# Altium integrated library Connecteurs.IntLib: 41 symbols
Pins are listed as number, name and electrical type; pins without a type are passive.

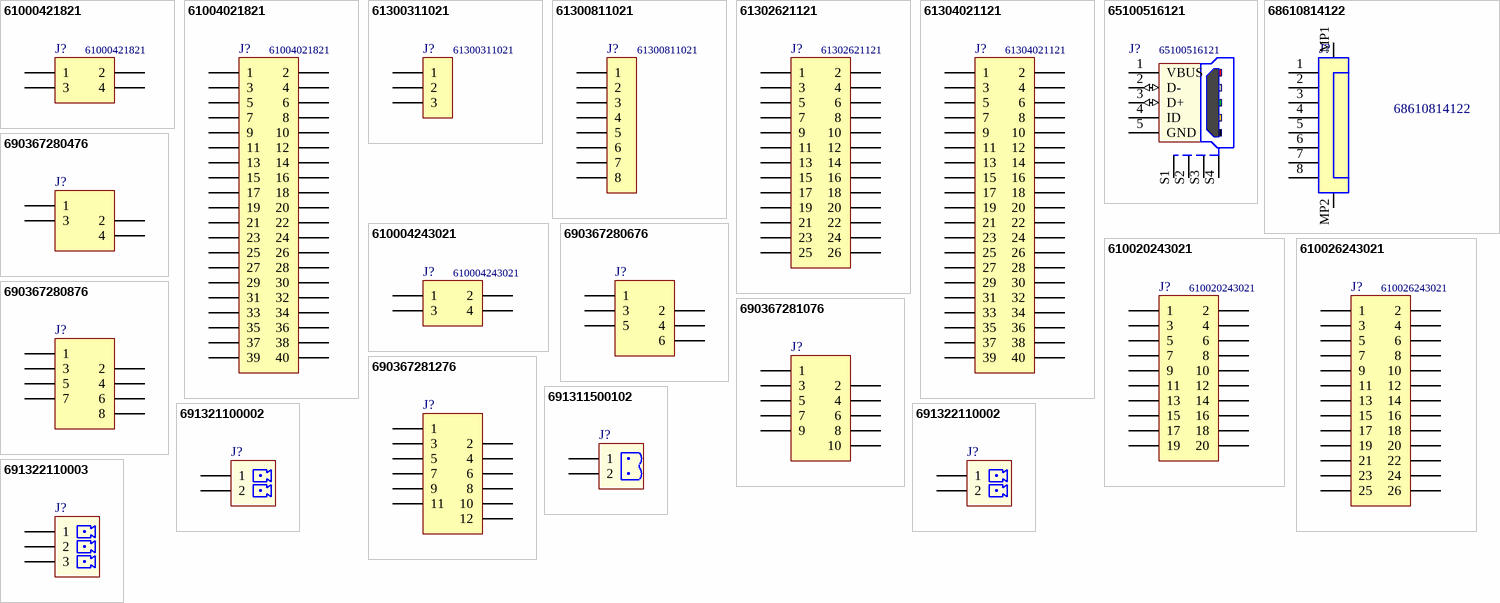
[diagram p0: symbols 61000421821 to 691322110003]

## 61000421821
designator J?
WR-PHD Socket Header, SMT, pitch 2.54mm, Dual Row, Vertical, 4p; Manufacturer: Wurth Elektronik; Value: 4; ComponentLink1Description: Datasheet; ComponentLink1URL: https://www.we-online.com/catalog/datasheet/61000421821.pdf; Manufacturer Part Number: 61000421821; Supplier 1: Farnell; Supplier Part Number 1: 2827865
footprint 61000421821
pins: 1, 2, 3, 4

## 61004021821
designator J?
WR-PHD Socket Header, SMT, pitch 2.54mm, Dual Row, Vertical, 40p; Manufacturer: Wurth Elektronik; Value: 40; ComponentLink1Description: Datasheet; ComponentLink1URL: https://www.we-online.com/catalog/datasheet/61004021821.pdf; Manufacturer Part Number: 61004021821; Supplier 1: Farnell; Supplier Part Number 1: 2827882
footprint 61004021821
pins: 1, 2, 3, 4, 5, 6, 7, 8, 9, 10, 11, 12, 13, 14, 15, 16, 17, 18, 19, 20, 21, 22, 23, 24, 25, 26, 27, 28, 29, 30, 31, 32, 33, 34, 35, 36, 37, 38, 39, 40

## 61300311021
designator J?
WR-PHD Header THT 2.54mm, Single Row, Angled, 3pin; Manufacturer: Wurth Electronics Inc.; Value: 3; ComponentLink1Description: Datasheet; ComponentLink1URL: https://www.we-online.com/catalog/datasheet/61300311021.pdf; Manufacturer Part Number: 61300311021; Supplier 1: Farnell; Supplier Part Number 1: 2356177
footprint 61300311021 (Pin Header, pitch 2.54 mm, THT, Angled, single row, 3p)
pins: 1, 2, 3

## 61300811021
designator J?
WR-PHD Header THT 2.54mm, Single Row, Angled, 8pin; Manufacturer: Wurth Electronics Inc.; Value: 8; ComponentLink1Description: Datasheet; ComponentLink1URL: https://www.we-online.com/catalog/datasheet/61300811021.pdf; Manufacturer Part Number: 61300811021; Supplier Part Number 1: 2356183; Supplier 1: Farnell
footprint 61300811021
pins: 1, 2, 3, 4, 5, 6, 7, 8

## 61302621121
designator J?
WR-PHD Pin Header, THT, pitch 2.54mm, Dual Row, Vertical, 26p; Manufacturer: Wurth Elektronik; Value: 26; ComponentLink1Description: Datasheet; ComponentLink1URL: https://www.we-online.com/catalog/datasheet/61302621121.pdf; Manufacturer Part Number: 61302621121; Supplier 1: Farnell; Supplier Part Number 1: 2356141
footprint 61302621121
pins: 1, 2, 3, 4, 5, 6, 7, 8, 9, 10, 11, 12, 13, 14, 15, 16, 17, 18, 19, 20, 21, 22, 23, 24, 25, 26

## 61304021121
designator J?
WR-PHD Pin Header, THT, pitch 2.54mm, Dual Row, Vertical, 40p; Manufacturer: Wurth Elektronik; Value: 40; ComponentLink1Description: Datasheet; ComponentLink1URL: https://www.we-online.com/catalog/datasheet/61304021121.pdf; Manufacturer Part Number: 61304021121; Supplier 1: Farnell; Supplier Part Number 1: 2356148
footprint 61304021121
pins: 1, 2, 3, 4, 5, 6, 7, 8, 9, 10, 11, 12, 13, 14, 15, 16, 17, 18, 19, 20, 21, 22, 23, 24, 25, 26, 27, 28, 29, 30, 31, 32, 33, 34, 35, 36, 37, 38, 39, 40

## 65100516121
designator J?
Mini USB 2.0 Type B, Receptacle, Horizontal, SMT; Manufacturer: Wurth Elektronik; Value: 5; ComponentLink1Description: Manufacturer; ComponentLink1URL: https://www.we-online.com/catalog/en/COM_SMT_MINI_TYPE_B_HORIZONTAL/#65100516121; ComponentLink2Description: Datasheet; ComponentLink2URL: https://katalog.we-online.com/em/datasheet/65100516121.pdf; Manufacturer Part Number: 65100516121; Supplier 1: Farnell; Supplier Part Number 1: 1642036
footprint 65100516121
pins: 1 VBUS, 2 D- (io), 3 D+ (io), 4 ID, 5 GND, S1 Shield, S2 Shield, S3 Shield, S4 Shield

## 68610814122
designator J?
WR-FPC SMT ZIF Horizontal Top Contact, pitch 1mm, 8p; Manufacturer: Wurth Electronics Inc.; Value: 8; Manufacturer Part Number: 68610814122; ComponentLink1URL: https://www.we-online.com/catalog/datasheet/68610814122.pdf; ComponentLink1Description: Datasheet; Supplier 1: Farnell; Supplier Part Number 1: 1641905
footprint 68610814122 (ZIF Connectors, Horizontal, Top Contact, pitch 1mm, 8p)
pins: 1, 2, 3, 4, 5, 6, 7, 8, MP1, MP2

## 610004243021
designator J?
WR-PHD Socket Header, SMT, pitch 2.54mm, Dual Row, Vertical, 4p; Manufacturer: Wurth Elektronik; Value: 4; ComponentLink1Description: Datasheet; ComponentLink1URL: https://www.we-online.com/catalog/datasheet/610004243021.pdf; Manufacturer Part Number: 610004243021; Supplier 1: Farnell; Supplier Part Number 1: 2827931
footprint 610004243021
footprint 610004243021_NO-HOLE (Socket Header, Pitch 2.54 mm, SMT, Vertical, dual row, 4p)
pins: 1, 2, 3, 4

## 610020243021
designator J?
WR-PHD Socket Header, SMT, pitch 2.54mm, Dual Row, Vertical, 20p; Manufacturer: Wurth Elektronik; Value: 20; ComponentLink1Description: Datasheet; ComponentLink1URL: https://www.we-online.com/catalog/datasheet/610020243021.pdf; Manufacturer Part Number: 610020243021; Supplier 1: Farnell; Supplier Part Number 1: 2827937
footprint 610020243021
footprint 610020243021_NO-HOLE (Socket Header, Pitch 2.54 mm, SMT, Vertical, dual row, 20p)
pins: 1, 2, 3, 4, 5, 6, 7, 8, 9, 10, 11, 12, 13, 14, 15, 16, 17, 18, 19, 20

## 610026243021
designator J?
WR-PHD Socket Header, SMT, pitch 2.54mm, Dual Row, Vertical, 26p; Manufacturer: Wurth Elektronik; Value: 26; ComponentLink1Description: Datasheet; ComponentLink1URL: https://www.we-online.com/catalog/datasheet/610026243021.pdf; Manufacturer Part Number: 610026243021; Supplier 1: Farnell; Supplier Part Number 1: 2827940
footprint 610026243021
footprint 610026243021_NO-HOLE (Socket Header, Pitch 2.54 mm, SMT, Vertical, dual row, 26p)
pins: 1, 2, 3, 4, 5, 6, 7, 8, 9, 10, 11, 12, 13, 14, 15, 16, 17, 18, 19, 20, 21, 22, 23, 24, 25, 26

## 690367280476
designator J?  (value not drawn)
WR-MM 4p Female SMT Connector with Polarization; Manufacturer: Wurth Electronics Inc.; Value: 4; ComponentLink1Description: Datasheet; ComponentLink1URL: http://katalog.we-online.de/em/datasheet/69036728xx76.pdf; Manufacturer Part Number: 690367280476; Supplier 1: Farnell; Supplier Part Number 1: 1641848
footprint 690367280476 (without Latch, 4 pins, SMT, straight)
pins: 1, 2, 3, 4

## 690367280676
designator J?  (value not drawn)
WR-MM 6p Female SMT Connector with Polarization; Manufacturer: Wurth Electronics Inc.; Value: 6; ComponentLink1Description: Datasheet; ComponentLink1URL: http://katalog.we-online.de/em/datasheet/69036728xx76.pdf; Manufacturer Part Number: 690367280676; Supplier 1: Farnell; Supplier Part Number 1: 1641849
footprint 690367280676 (without Latch, 6 pins, SMT, straight)
pins: 1, 2, 3, 4, 5, 6

## 690367280876
designator J?  (value not drawn)
WR-MM 8p Female SMT Connector with Polarization; Manufacturer: Wurth Electronics Inc.; Value: 8; Manufacturer Part Number: 690367280876; ComponentLink1Description: Datasheet; ComponentLink1URL: http://katalog.we-online.de/em/datasheet/69036728xx76.pdf; Supplier 1: Farnell; Supplier Part Number 1: 1641850
footprint 690367280876 (without Latch, 8 pins, SMT, straight)
pins: 1, 2, 3, 4, 5, 6, 7, 8

## 690367281076
designator J?  (value not drawn)
WR-MM 10p Female SMT Connector with Polarization; Manufacturer: Wurth Electronics Inc.; Value: 10; Manufacturer Part Number: 690367281076; ComponentLink1Description: Datasheet; ComponentLink1URL: http://katalog.we-online.de/em/datasheet/69036728xx76.pdf; Supplier 1: Farnell; Supplier Part Number 1: 1641851
footprint 690367281076 (without Latch, 10 pins, SMT, straight)
pins: 1, 2, 3, 4, 5, 6, 7, 8, 9, 10

## 690367281276
designator J?  (value not drawn)
WR-MM 12p Female SMT Connector with Polarization; Manufacturer: Wurth Electronics Inc.; Value: 12; Manufacturer Part Number: 690367281276; ComponentLink1Description: Datasheet; ComponentLink1URL: http://katalog.we-online.de/em/datasheet/69036728xx76.pdf; Supplier 1: Farnell; Supplier Part Number 1: 2984330
footprint 690367281276 (without Latch, 12 pins, SMT, straight)
pins: 1, 2, 3, 4, 5, 6, 7, 8, 9, 10, 11, 12

## 691311500102
designator J?  (value not drawn)
WR-TBL 2p Series 311 - 5.08 mm Closed Vertical PCB Header; Manufacturer: Wurth Electronics Inc.; Value: 2; Manufacturer Part Number: 691311500102; ComponentLink1Description: Datasheet; ComponentLink1URL: https://katalog.we-online.de/em/datasheet/6913115001xx.pdf; Supplier 1: Farnell; Supplier Part Number 1: 1641978
footprint 691311500102 (5,08mm - PCB Headers - Vertical - Closed ends -02p)
pins: 1, 2

## 691321100002
designator J?  (value not drawn)
WR-TBL 2p Series 3211 - 3.50 mm Vertical PCB Header; Manufacturer: Wurth Electronics Inc.; Value: 2; Supplier 1: Farnell; Manufacturer Part Number: 691321100002; Supplier Part Number 1: 1841308; ComponentLink1Description: Datasheet; ComponentLink1URL: https://katalog.we-online.de/em/datasheet/6913211000xx.pdf
footprint 691321100002 (Vertical PCB Header, pitch 3.5mm, 02p)
pins: 1, 2

## 691322110002
designator J?  (value not drawn)
WR-TBL 2p Series 3221 - 3.50 mm Horizontal PCB Header; Manufacturer: Wurth Electronics Inc.; Value: 2; Supplier 1: Farnell; Manufacturer Part Number: 691322110002; Supplier Part Number 1: 1841315; ComponentLink1Description: Datasheet; ComponentLink1URL: http://katalog.we-online.de/em/datasheet/6913221100xx.pdf
footprint 691322110002 (Horizontal PCB Header, pitch 3.5mm, 02p)
pins: 1, 2

## 691322110003
designator J?  (value not drawn)
WR-TBL 3p Series 3221 - 3.50 mm Horizontal PCB Header; Manufacturer: Wurth Electronics Inc.; Value: 3; Supplier 1: Farnell; Manufacturer Part Number: 691322110003; Supplier Part Number 1: 1841316; ComponentLink1Description: Datasheet; ComponentLink1URL: http://katalog.we-online.de/em/datasheet/6913221100xx.pdf
footprint 691322110003 (Horizontal PCB Header, pitch 3.5mm, 03p)
pins: 1, 2, 3


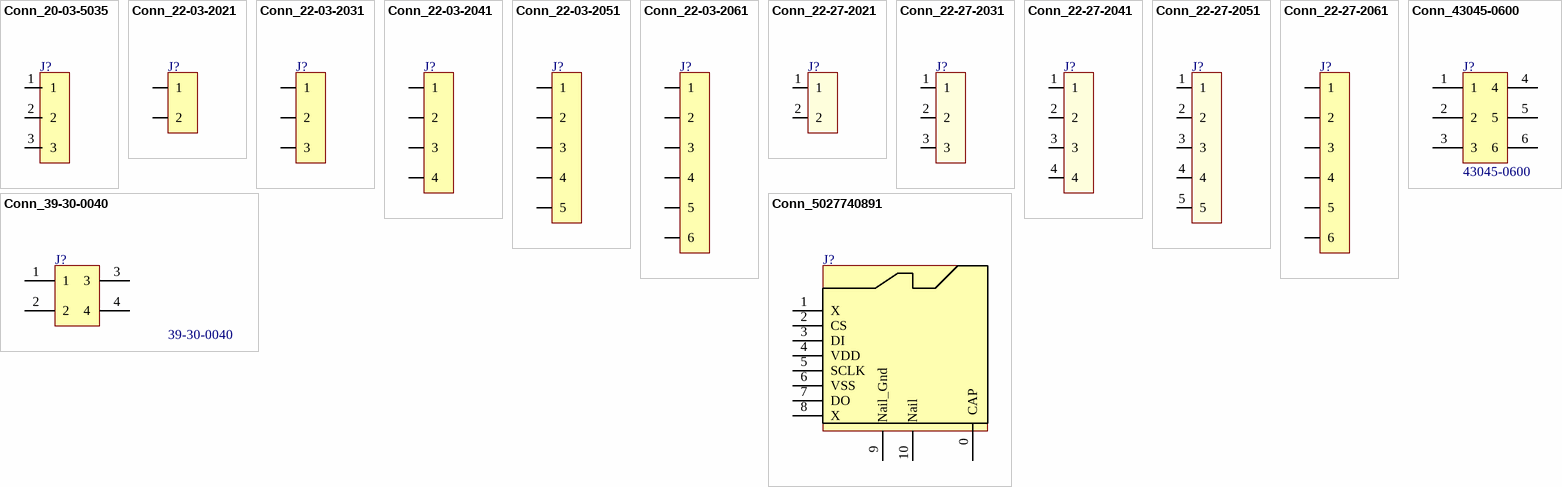
[diagram p1: symbols Conn_20-03-5035 to Conn_5027740891]

## Conn_20-03-5035
designator J?, comment 22-03-5035  (value not drawn)
CONN HEADER VERT 3POS 2.5MM; Manufacturer: MOLEX; Supplier 1: Farnell; Supplier Part Number 1: 9979620; Manufacturer Part Number: 22-03-5035; ComponentLink1URL: http://www.farnell.com/datasheets/1801024.pdf; ComponentLink1Description: Datasheet; ComponentLink2URL: http://www.farnell.com/cad/495071.pdf  http://www.farnell.com/cad/1533907.pdf  http://www.farnell.com/cad/1533907.pdf; ComponentLink2Description: Drawings
footprint Conn_20-03-5035
pins: 1, 2, 3

## Conn_22-03-2021
designator J?, comment 22-03-2021  (value not drawn)
CONN HEADER VERT 2POS 2.54MM; Manufacturer: MOLEX; Supplier 1: Farnell; Supplier Part Number 1: 9731075; Manufacturer Part Number: 22-03-2021; ComponentLink1URL: http://www.farnell.com/datasheets/1791308.pdf; ComponentLink1Description: Datasheet; ComponentLink2URL: http://www.farnell.com/cad/495071.pdf  http://www.farnell.com/cad/1533907.pdf  http://www.farnell.com/cad/1533907.pdf; ComponentLink2Description: Drawings
footprint Conn_22-03-2021
pins: 1, 2

## Conn_22-03-2031
designator J?, comment 22-03-2031  (value not drawn)
CONN HEADER VERT 3POS 2.54MM; Manufacturer: MOLEX; Supplier 1: Farnell; Supplier Part Number 1: 9731083; Manufacturer Part Number: 22-03-2031; ComponentLink1URL: http://www.farnell.com/datasheets/1785732.pdf; ComponentLink1Description: Datasheet; ComponentLink2URL: http://www.farnell.com/cad/495071.pdf  http://www.farnell.com/cad/1533907.pdf  http://www.farnell.com/cad/1533907.pdf; ComponentLink2Description: Drawings
footprint Conn_22-03-2031
pins: 1, 2, 3

## Conn_22-03-2041
designator J?, comment 22-03-2041  (value not drawn)
CONN HEADER VERT 4POS 2.54MM; Manufacturer: MOLEX; Manufacturer Part Number: 22-03-2041; Supplier 1: Farnell; Supplier Part Number 1: 9731091; ComponentLink1Description: Datasheet; ComponentLink1URL: https://www.molex.com/pdm_docs/sd/022032041_sd.pdf
footprint Conn_22-03-2041
pins: 1, 2, 3, 4

## Conn_22-03-2051
designator J?, comment 22-03-2051  (value not drawn)
CONN HEADER VERT 5POS 2.54MM; Manufacturer: MOLEX; Supplier 1: Farnell; Supplier Part Number 1: 9731105; Manufacturer Part Number: 22-03-2051; ComponentLink1URL: http://www.farnell.com/datasheets/1803075.pdf; ComponentLink1Description: Datasheet; ComponentLink2URL: http://www.farnell.com/cad/1533907.pdf; ComponentLink2Description: Drawings
footprint Conn_22-03-2051
pins: 1, 2, 3, 4, 5

## Conn_22-03-2061
designator J?, comment 22-03-2061  (value not drawn)
CONN HEADER VERT 6POS 2.54MM; Manufacturer: MOLEX; Supplier 1: Farnell; Supplier Part Number 1: 9731113; Manufacturer Part Number: 22-03-2061; ComponentLink1URL: http://www.farnell.com/datasheets/1791310.pdf; ComponentLink1Description: Datasheet; ComponentLink2URL: http://www.farnell.com/cad/1533907.pdf; ComponentLink2Description: Drawings
footprint Conn_22-03-2061
pins: 1, 2, 3, 4, 5, 6

## Conn_22-27-2021
designator J?, comment 22-27-2021  (value not drawn)
CONN HEADER VERT KK 2POS 2.54MM; Manufacturer: MOLEX; Supplier 1: Farnell; Supplier Part Number 1: 9731148; Manufacturer Part Number: 22-27-2021; ComponentLink1URL: http://www.farnell.com/datasheets/1795001.pdf; ComponentLink1Description: Datasheet; ComponentLink2URL: http://www.farnell.com/cad/1595526.pdf; ComponentLink2Description: Drawings
footprint Conn_22-27-2021
pins: 1, 2

## Conn_22-27-2031
designator J?, comment 22-27-2031  (value not drawn)
CONN HEADER VERT KK 3POS 2.54MM; Manufacturer: MOLEX; Supplier 1: Farnell; Supplier Part Number 1: 9731156; Manufacturer Part Number: 22-27-2031; ComponentLink1URL: http://www.farnell.com/datasheets/1803078.pdf; ComponentLink1Description: Datasheet; ComponentLink2URL: http://www.farnell.com/cad/1595526.pdf; ComponentLink2Description: Drawings
footprint Conn_22-27-2031
pins: 1, 2, 3

## Conn_22-27-2041
designator J?, comment 22-27-2041  (value not drawn)
CONN HEADER VERT KK 4POS 2.54MM; Manufacturer: MOLEX; Supplier 1: Farnell; Supplier Part Number 1: 9731164; Manufacturer Part Number: 22-27-2041; ComponentLink1URL: http://www.farnell.com/datasheets/1803079.pdf; ComponentLink1Description: Datasheet; ComponentLink2URL: http://www.farnell.com/cad/1595526.pdf; ComponentLink2Description: Drawings
footprint Conn_22-27-2041
pins: 1, 2, 3, 4 (power)

## Conn_22-27-2051
designator J?, comment 22-27-2051  (value not drawn)
CONN HEADER VERT KK 5POS 2.54MM; Manufacturer: MOLEX; Supplier 1: Farnell; Supplier Part Number 1: 9731679; Manufacturer Part Number: 22-27-2051; ComponentLink1URL: http://www.farnell.com/datasheets/1802972.pdf; ComponentLink1Description: Datasheet; ComponentLink2URL: http://www.farnell.com/cad/1595526.pdf; ComponentLink2Description: Drawings
footprint Conn_22-27-2051
pins: 1, 2, 3, 4, 5

## Conn_22-27-2061
designator J?, comment 22-27-2061  (value not drawn)
CONN HEADER VERT KK 6POS 2.54MM; Manufacturer: MOLEX; Supplier 1: Farnell; Supplier Part Number 1: 9731172; Manufacturer Part Number: 22-27-2061; ComponentLink1URL: http://www.farnell.com/datasheets/1791334.pdf; ComponentLink1Description: Datasheet; ComponentLink2URL: http://www.farnell.com/cad/1595526.pdf; ComponentLink2Description: Drawings
footprint Conn_22-27-2061
pins: 1, 2, 3, 4, 5, 6

## Conn_39-30-0040
designator J?, comment 39-30-0040
CONN HEADER R/A  MINI-FIT 4POS 4.2MM; Manufacturer: MOLEX; Supplier 1: Farnell; Supplier Part Number 1: 1697133; Manufacturer Part Number: 39-30-0040; ComponentLink1URL: https://www.molex.com/pdm_docs/sd/039300040_sd.pdf; ComponentLink1Description: Datasheet
footprint Conn_39-30-0040 (4 pins, straight)
pins: 1, 2, 3, 4

## Conn_43045-0600
designator J?, comment 43045-0600
CONN HEADER R/A MICRO-FIT 6POS 3MM; Manufacturer: MOLEX; Supplier 1: Farnell; Manufacturer Part Number: 43045-0600; ComponentLink1URL: http://www.farnell.com/datasheets/2216475.pdf; ComponentLink1Description: Datasheet; Supplier Part Number 1: 1012252
footprint Conn_43045-0600 (6 pins, straight)
pins: 1, 2, 3, 4, 5, 6

## Conn_5027740891
designator J?, comment 5027740891  (value not drawn)
CONN MICRO SD CARD PUSH-PUSH R/A; Manufacturer: MOLEX; Manufacturer Part Number: 5027740891; Supplier 1: Farnell; Supplier Part Number 1: 2064063; ComponentLink2Description: Drawings; ComponentLink2URL: https://www.molex.com/pdm_docs/sd/5027740891_sd.pdf; ComponentLink1Description: Datasheet; ComponentLink1URL: https://www.molex.com/pdm_docs/sd/5027740891_sd.pdf
footprint Conn_502774-0891
pins: 0 CAP, 1 X, 2 CS, 3 DI, 4 VDD, 5 SCLK, 6 VSS, 7 DO, 8 X, 9 Nail_Gnd, 10 Nail


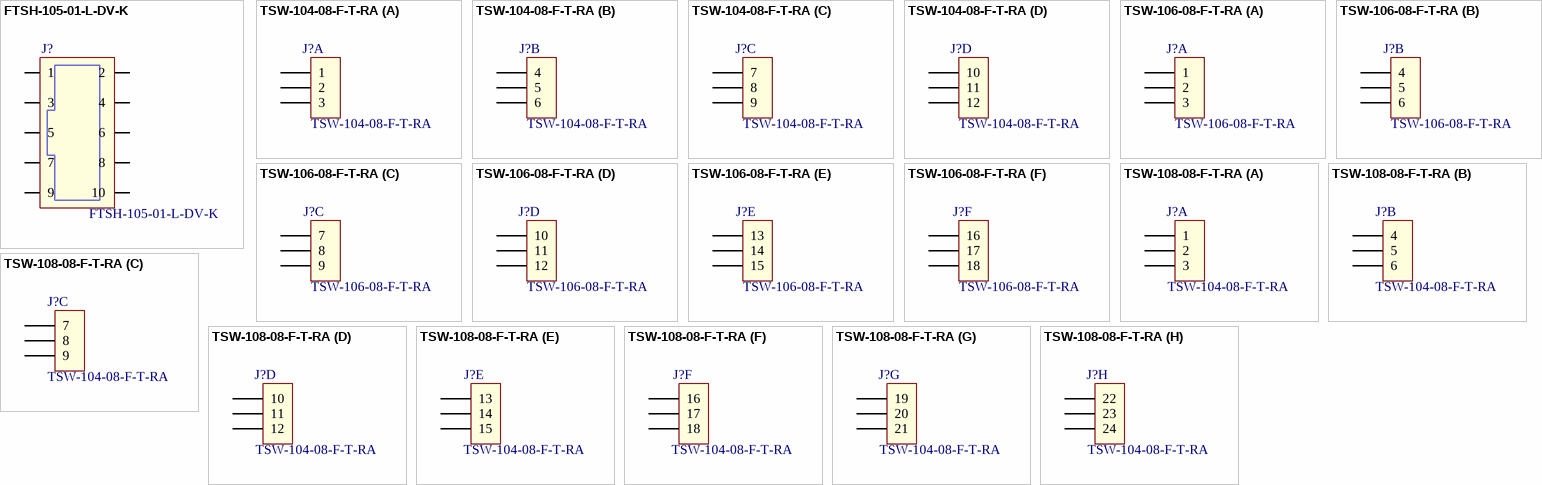
[diagram p2: symbols FTSH-105-01-L-DV-K to TSW-108-08-F-T-RA]

## FTSH-105-01-L-DV-K
designator J?
CONN HEADER 10 POS DUAL .05" SMD with Keying; Manufacturer: SAMTEC; Supplier 1: Digi-Key; Manufacturer Part Number: FTSH-105-01-L-DV-K; ComponentLink1URL: http://suddendocs.samtec.com/prints/ftsh-1xx-xx-xxx-dv-xxx-xxx-mkt.pdf; ComponentLink1Description: Datasheet; Supplier Part Number 1: SAM8799-ND
footprint FTSH-105-01-L-DV-K (CONN HEADER 10 POS DUAL .05" SMD)
pins: 1, 2, 3, 4, 5, 6, 7, 8, 9, 10

## TSW-104-08-F-T-RA
designator J?
CONN HEADER R/A 3L x 4POS 2.54MM; Manufacturer: SAMTEC; Manufacturer Part Number: TSW-104-08-F-T-RA; Supplier 1: Farnell; Supplier Part Number 1: 2053041; ComponentLink1Description: Datasheet; ComponentLink1URL: http://cloud.samtec.com/catalog_english/TSW_TH.PDF
footprint TSW-104-08-F-T-RA
part A pins: 1, 2, 3
part B pins: 4, 5, 6
part C pins: 7, 8, 9
part D pins: 10, 11, 12

## TSW-106-08-F-T-RA
designator J?
CONN HEADER R/A 3L x 6POS 2.54MM; Manufacturer: SAMTEC; Manufacturer Part Number: TSW-106-08-F-T-RA; ComponentLink1Description: Datasheet; ComponentLink1URL: http://cloud.samtec.com/catalog_english/TSW_TH.PDF; Supplier 1: Farnell; Supplier Part Number 1: 2053043
footprint TSW-106-08-F-T-RA
part A pins: 1, 2, 3
part B pins: 4, 5, 6
part C pins: 7, 8, 9
part D pins: 10, 11, 12
part E pins: 13, 14, 15
part F pins: 16, 17, 18

## TSW-108-08-F-T-RA
designator J?, comment TSW-104-08-F-T-RA
CONN HEADER R/A 3L x 8POS 2.54MM; Manufacturer: SAMTEC; Manufacturer Part Number: TSW-104-08-F-T-RA; Supplier 1: Farnell; ComponentLink1Description: Datasheet; ComponentLink1URL: http://cloud.samtec.com/catalog_english/TSW_TH.PDF; Supplier Part Number 1: 2053046
footprint TSW-108-08-F-T-RA
part A pins: 1, 2, 3
part B pins: 4, 5, 6
part C pins: 7, 8, 9
part D pins: 10, 11, 12
part E pins: 13, 14, 15
part F pins: 16, 17, 18
part G pins: 19, 20, 21
part H pins: 22, 23, 24


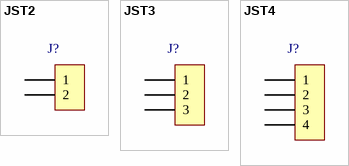
[diagram p3: symbols JST2 to JST4]

## JST2
designator J?
footprint JST2 (JST Connector With 2 Pins)
pins: 1, 2

## JST3
designator J?
footprint JST3 (JST Connector With 3 Pins)
pins: 1, 2, 3

## JST4
designator J?
footprint JST4 (JST Connector With 4 Pins)
pins: 1, 2, 3, 4